# Altium footprint library AMLB_v1.PcbLib: 167 footprints (part 4 of 11)
Each footprint in its own frame and in the unit in brackets; x right, y up, seen from the top. Pads: shape width x height; smd on the part's side, far side on the other; paste and mask are expansions set on the pad; w line width, h text height; cw(c..) or ccw(c..) is an arc to the next point about the centre after c.
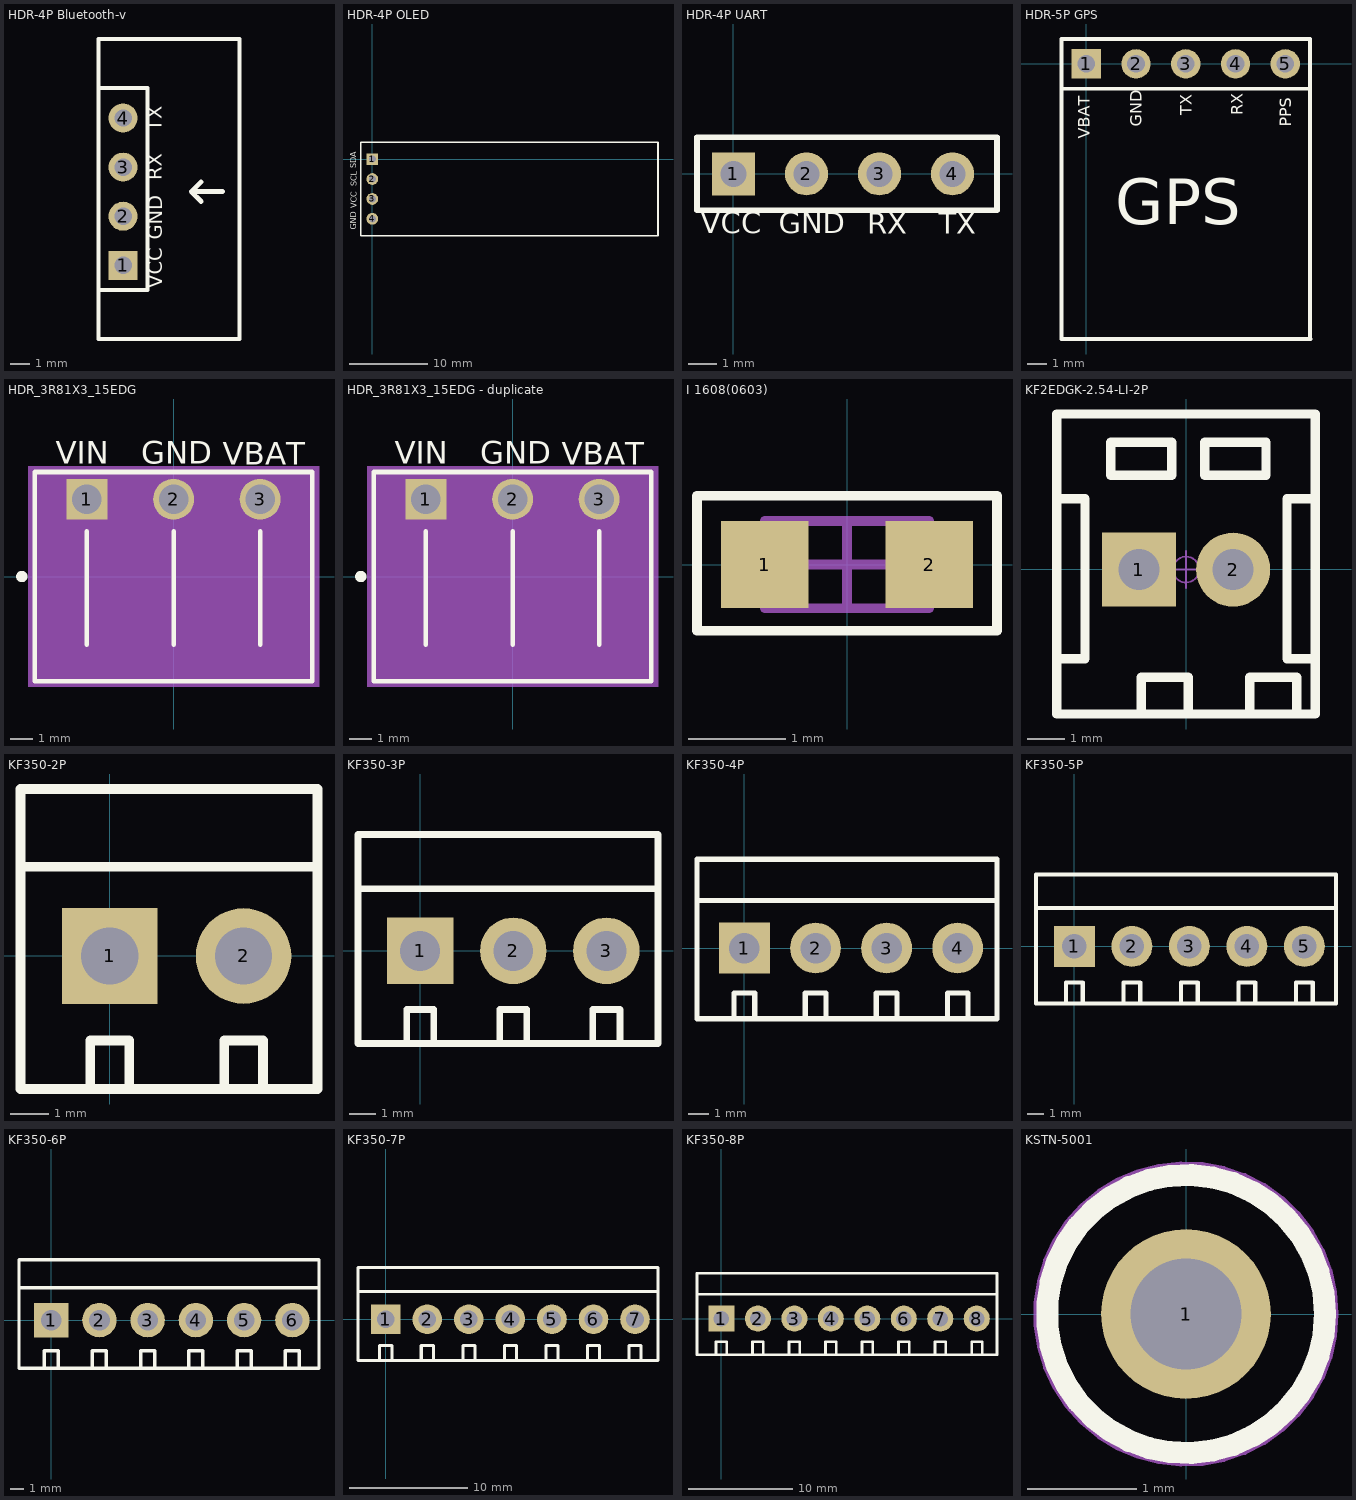
[diagram p3: the footprints below, top view; thin cyan lines are the x and y axes]

## HDR-4P Bluetooth-v [mm] "Connector; Header; 4 Position"
height 10
pads (4):
  rect 1.5x1.5 hole 0.9: 1(-11.989,-35.687)
  round 1.5 hole 0.9: 2(-11.989,-33.147) 3(-11.989,-30.607) 4(-11.989,-28.067)
Top Overlay:
  lines w0.2: -13.259,-39.497 -13.259,-23.978 -5.969,-23.978 -5.969,-39.497 -13.259,-39.497 ; -13.259,-36.957 -13.259,-26.518 -10.719,-26.518 -10.719,-36.957 -13.259,-36.957
  lines w0.254: -7.95,-32.385 -8.458,-31.877 ; -7.95,-31.369 -8.458,-31.877 ; -6.833,-31.877 -8.458,-31.877
  text "VCC" at -9.714,-36.881 h1.27
  text "RX" at -9.728,-31.293 h1.27
  text "TX" at -9.728,-28.753 h1.27
  text "GND" at -9.714,-34.366 h1.27
3D body "HDR2.54-1P_M.STEP": height 8.5, standoff -3, extent -13.259,-34.417 -10.719,-31.877
3D body "HDR2.54-1P_M.STEP": height 8.5, standoff -3, extent -13.259,-36.957 -10.719,-34.417
3D body "HDR2.54-1P_M.STEP": height 8.5, standoff -3, extent -13.259,-29.337 -10.719,-26.797
3D body "HDR2.54-1P_M.STEP": height 8.5, standoff -3, extent -13.259,-31.877 -10.719,-29.337

## HDR-4P OLED [mm] "Connector; Header; 4Position"
height 10
pads (4):
  rect 1.5x1.5 hole 0.9: 1(0,0)
  round 1.5 hole 0.9: 2(0,-2.54) 3(0,-5.08) 4(0,-7.62)
Top Overlay:
  lines w0.2: -1.5,-9.81 36.5,-9.81 36.5,2.19 -1.5,2.19 -1.5,-9.81
  text "VCC" at -1.753,-6.299 h1.27
  text "SDA" at -1.829,-1.168 h1.27
  text "SCL" at -1.753,-3.48 h1.27
  text "GND" at -1.803,-8.992 h1.27
3D body "HDR2.54-1P_M.STEP": height 8.5, standoff -3, extent -1.27,-3.81 1.27,-1.27
3D body "HDR2.54-1P_M.STEP": height 8.5, standoff -3, extent -1.27,-1.27 1.27,1.27
3D body "HDR2.54-1P_M.STEP": height 8.5, standoff -3, extent -1.27,-8.89 1.27,-6.35
3D body "HDR2.54-1P_M.STEP": height 8.5, standoff -3, extent -1.27,-6.35 1.27,-3.81

## HDR-4P UART [mm] "Connector; Header; 4 Position"
height 10
pads (4):
  rect 1.5x1.5 hole 0.9: 1(0,0)
  round 1.5 hole 0.9: 2(2.54,0) 3(5.08,0) 4(7.62,0)
Top Overlay:
  lines w0.2: -1.27,-1.27 -1.27,1.27 9.169,1.27 9.169,-1.27 -1.27,-1.27
  text "GND" at 1.575,-2.311 h1.27
  text "TX" at 7.137,-2.325 h1.27
  text "RX" at 4.648,-2.325 h1.27
  text "VCC" at -1.143,-2.311 h1.27
3D body "HDR2.54-1P.STEP": height 8.5, standoff -3, extent -1.27,-1.27 1.27,1.27
3D body "HDR2.54-1P.STEP": height 8.5, standoff -3, extent 1.27,-1.27 3.81,1.27
3D body "HDR2.54-1P.STEP": height 8.5, standoff -3, extent 3.81,-1.27 6.35,1.27
3D body "HDR2.54-1P.STEP": height 8.5, standoff -3, extent 6.35,-1.27 8.89,1.27

## HDR-5P GPS [mm] "Connector; Header; 5 Position"
height 10
pads (5):
  rect 1.5x1.5 hole 0.9: 1(0,0)
  round 1.5 hole 0.9: 2(2.54,0) 3(5.08,0) 4(7.62,0) 5(10.16,0)
Top Overlay:
  lines w0.2: -1.27,-1.143 -1.27,-14.046 11.455,-14.046 ; 11.43,-14.046 11.43,-1.041 ; -1.27,-1.27 11.43,-1.27 11.43,1.27 -1.27,1.27 -1.27,-1.27
  text "GPS" at 1.473,-8.966 h4
  text "VBAT" at 0.178,-3.81 h0.6
  text "GND" at 2.845,-3.21 h0.6
  text "TX" at 5.385,-2.61 h0.6
  text "RX" at 8.001,-2.61 h0.6
  text "PPS" at 10.465,-3.21 h0.6
3D body "HDR2.54-1P_M.STEP": height 8.5, standoff -3, extent 8.89,-1.27 11.43,1.27
3D body "HDR2.54-1P_M.STEP": height 8.5, standoff -3, extent 3.81,-1.27 6.35,1.27
3D body "HDR2.54-1P_M.STEP": height 8.5, standoff -3, extent 6.35,-1.27 8.89,1.27
3D body "HDR2.54-1P_M.STEP": height 8.5, standoff -3, extent -1.27,-1.27 1.27,1.27
3D body "HDR2.54-1P_M.STEP": height 8.5, standoff -3, extent 1.27,-1.27 3.81,1.27

## HDR_3R81X3_15EDG [mm] "HDR_3R81X3_15EDG"
pads (3):
  rect 1.8x1.8 / inner round 1.524 / far side rect 1.8x1.8 hole 1.3: 1(-3.81,3.4)
  round 1.8 / inner round 1.524 / far side round 1.8 hole 1.3: 2(0,3.4) 3(3.81,3.4)
Top Overlay:
  circle w0.25: c-6.675,0 r0.125
  lines w0.001: -6.115,-4.6 -6.115,4.6 6.115,4.6 6.115,-4.6 -6.115,-4.6
  lines w0.1: -6.115,-4.6 -6.115,4.6 6.115,4.6 6.115,-4.6 -6.115,-4.6
  lines w0.2: -3.81,-3 -3.81,2 ; 0,-3 0,2 ; 3.81,-3 3.81,2 ; -6.1,-4.6 -6.1,4.6 6.1,4.6 6.1,-4.6 -6.1,-4.6
  text "VBAT" at 2.159,4.928 h1
  text "GND" at -1.422,4.953 h1
  text "VIN" at -5.182,4.953 h1
Mechanical 8:
  text "1" at -3.81,3.146 h0.64
  text "2" at 0,3.146 h0.64
  text "3" at 3.81,3.146 h0.64
Mechanical 10:
  circle w0.05: c-3.81,0 r0.35
  region: -6.4,-4.85 -6.4,4.85 6.4,4.85 6.4,-4.85
  lines w0.05: -4.31,0 -3.31,0 ; -3.81,-0.5 -3.81,0.5
Mechanical 11:
  pour cut-out: -6.4,-4.85 -6.4,4.85 6.4,4.85 6.4,-4.85

## HDR_3R81X3_15EDG - duplicate [mm] "HDR_3R81X3_15EDG"
pads (3):
  rect 1.8x1.8 / inner round 1.524 / far side rect 1.8x1.8 hole 1.3: 1(-3.81,3.4)
  round 1.8 / inner round 1.524 / far side round 1.8 hole 1.3: 2(0,3.4) 3(3.81,3.4)
Top Overlay:
  circle w0.25: c-6.675,0 r0.125
  lines w0.001: -6.115,-4.6 6.115,-4.6 6.115,4.6 -6.115,4.6 -6.115,-4.6
  lines w0.1: -6.115,-4.6 6.115,-4.6 6.115,4.6 -6.115,4.6 -6.115,-4.6
  lines w0.2: -3.81,-3 -3.81,2 ; 0,-3 0,2 ; 3.81,-3 3.81,2 ; -6.1,-4.6 6.1,-4.6 6.1,4.6 -6.1,4.6 -6.1,-4.6
  text "VIN" at -5.182,4.953 h1
  text "GND" at -1.422,4.953 h1
  text "VBAT" at 2.159,4.928 h1
Mechanical 8:
  text "3" at 3.81,3.146 h0.64
  text "2" at 0,3.146 h0.64
  text "1" at -3.81,3.146 h0.64
Mechanical 10:
  circle w0.05: c-3.81,0 r0.35
  region: -6.4,-4.85 -6.4,4.85 6.4,4.85 6.4,-4.85
  lines w0.05: -4.31,0 -3.31,0 ; -3.81,-0.5 -3.81,0.5
Mechanical 11:
  pour cut-out: -6.4,-4.85 -6.4,4.85 6.4,4.85 6.4,-4.85

## I 1608(0603) [mm] "Chip Inductance, 2-Leads, Body 1.60x0.80mm, IPC Medium Density"
height 0.6
pads (2):
  rect 0.9x0.9 smd: 1(-0.85,0) 2(0.85,0)
Top Overlay:
  lines w0.1: -1.549,-0.686 -1.549,0.711 1.549,0.711 1.549,-0.686 -1.549,-0.686
Mechanical 13:
  lines w0.1: -0.85,-0.45 0.85,-0.45 0.85,0.45 -0.85,0.45 -0.85,-0.45
Mechanical 15:
  lines w0.05: -1.55,-0.7 1.55,-0.7 1.55,0.7 -1.55,0.7 -1.55,-0.7
  lines w0.1: -0.45,0 0.45,0 ; 0,-0.45 0,0.45
3D body "User Library-V0603HD.STEP": height 0.8, standoff 0, extent -0.825,-0.443 0.775,0.457

## KF2EDGK-2.54-LI-2P [mm] "长：6.93mm，宽：8.1mm，高：10.1mm"
pads (2):
  rect 2x2 hole 1.1: 1(-1.27,-0.009)
  round 2 hole 1.1: 2(1.27,-0.009)
Top Overlay:
  lines w0.254: -1.204,-3.848 -1.204,-2.921 0.066,-2.921 0.066,-3.848 ; 1.717,-3.848 1.717,-2.921 2.987,-2.921 2.987,-3.848 ; 3.49,-2.413 2.728,-2.413 2.728,1.905 3.49,1.905 ; -3.49,-2.413 -3.49,-3.909 3.49,-3.909 3.49,1.905 ; -3.49,-2.413 -2.728,-2.413 -2.728,1.905 -3.49,1.905 ; -3.49,-2.413 -3.49,1.905 ; -3.49,1.905 -3.49,4.191 3.49,4.191 3.49,1.905 ; -2.032,2.54 -0.381,2.54 -0.381,3.429 -2.032,3.429 -2.032,2.54 ; 0.508,2.54 0.508,3.429 2.159,3.429 2.159,2.54 0.508,2.54
Mechanical 15:
  circle w0.05: c0,-0.009 r0.35
  lines w0.05: -0.5,-0.009 0.5,-0.009 ; 0,-0.509 0,0.491
3D body "KF2EDGK-2.54-LI-2P.STEP": height 10.15, standoff -3.15, extent -3.49,-3.909 3.49,4.191

## KF350-2P [mm] "可拼接端子/10A"
pads (2):
  rect 2.5x2.5 hole 1.5: 1(0,0)
  round 2.5 hole 1.5: 2(3.5,0)
Top Overlay:
  lines w0.254: -2.337,2.337 5.436,2.337 ; -0.508,-3.48 -0.508,-2.21 0.508,-2.21 0.508,-3.48 ; 2.992,-3.48 2.992,-2.21 4.008,-2.21 4.008,-3.48 ; -2.337,-3.48 -2.337,4.369 5.436,4.369 5.436,-3.48 -2.337,-3.48
3D body "KF350.STEP": height 10, standoff -3.8, extent 1.35,-3.3 5.25,4.2
3D body "KF350.STEP": height 10, standoff -3.8, extent -2.15,-3.3 1.75,4.2

## KF350-3P [mm] "可拼接端子/10A"
pads (3):
  rect 2.5x2.5 hole 1.5: 1(0,0)
  round 2.5 hole 1.5: 2(3.5,0) 3(7,0)
Top Overlay:
  lines w0.254: -2.337,2.337 8.941,2.337 ; -0.508,-3.48 -0.508,-2.21 0.508,-2.21 0.508,-3.48 ; 2.992,-3.48 2.992,-2.21 4.008,-2.21 4.008,-3.48 ; 6.492,-3.48 6.492,-2.21 7.508,-2.21 7.508,-3.48 ; -2.337,-3.48 -2.337,4.369 8.941,4.369 8.941,-3.48 -2.337,-3.48
3D body "KF350.STEP": height 10, standoff -3.8, extent 1.35,-3.3 5.25,4.2
3D body "KF350.STEP": height 10, standoff -3.8, extent -2.15,-3.3 1.75,4.2
3D body "KF350.STEP": height 10, standoff -3.8, extent 4.85,-3.3 8.75,4.2

## KF350-4P [mm] "可拼接端子/10A"
pads (4):
  rect 2.5x2.5 hole 1.5: 1(0,0)
  round 2.5 hole 1.5: 2(3.5,0) 3(7,0) 4(10.5,0)
Top Overlay:
  lines w0.254: -2.337,2.337 12.436,2.337 ; -0.508,-3.48 -0.508,-2.21 0.508,-2.21 0.508,-3.48 ; 2.992,-3.48 2.992,-2.21 4.008,-2.21 4.008,-3.48 ; 6.492,-3.48 6.492,-2.21 7.508,-2.21 7.508,-3.48 ; 9.992,-3.48 9.992,-2.21 11.008,-2.21 11.008,-3.48 ; -2.337,-3.48 12.436,-3.48 12.436,4.369 -2.337,4.369 -2.337,-3.48
3D body "KF350.STEP": height 10, standoff -3.8, extent 8.35,-3.3 12.25,4.2
3D body "KF350.STEP": height 10, standoff -3.8, extent 4.85,-3.3 8.75,4.2
3D body "KF350.STEP": height 10, standoff -3.8, extent 1.35,-3.3 5.25,4.2
3D body "KF350.STEP": height 10, standoff -3.8, extent -2.15,-3.3 1.75,4.2

## KF350-5P [mm] "可拼接端子/10A"
pads (5):
  rect 2.5x2.5 hole 1.5: 1(0,0)
  round 2.5 hole 1.5: 2(3.5,0) 3(7,0) 4(10.5,0) 5(14,0)
Top Overlay:
  lines w0.254: -2.337,2.337 15.926,2.337 ; -0.508,-3.48 -0.508,-2.21 0.508,-2.21 0.508,-3.48 ; 2.992,-3.48 2.992,-2.21 4.008,-2.21 4.008,-3.48 ; 6.492,-3.48 6.492,-2.21 7.508,-2.21 7.508,-3.48 ; 9.992,-3.48 9.992,-2.21 11.008,-2.21 11.008,-3.48 ; 13.492,-3.48 13.492,-2.21 14.508,-2.21 14.508,-3.48 ; -2.337,-3.48 -2.337,4.369 15.926,4.369 15.926,-3.48 -2.337,-3.48
3D body "KF350.STEP": height 10, standoff -3.8, extent -2.15,-3.3 1.75,4.2
3D body "KF350.STEP": height 10, standoff -3.8, extent 1.35,-3.3 5.25,4.2
3D body "KF350.STEP": height 10, standoff -3.8, extent 4.85,-3.3 8.75,4.2
3D body "KF350.STEP": height 10, standoff -3.8, extent 8.35,-3.3 12.25,4.2
3D body "KF350.STEP": height 10, standoff -3.8, extent 11.85,-3.3 15.75,4.2

## KF350-6P [mm] "可拼接端子/10A"
pads (6):
  rect 2.5x2.5 hole 1.5: 1(0,0)
  round 2.5 hole 1.5: 2(3.5,0) 3(7,0) 4(10.5,0) 5(14,0) 6(17.5,0)
Top Overlay:
  lines w0.254: -2.337,2.337 19.41,2.337 ; -0.508,-3.48 -0.508,-2.21 0.508,-2.21 0.508,-3.48 ; 2.992,-3.48 2.992,-2.21 4.008,-2.21 4.008,-3.48 ; 6.492,-3.48 6.492,-2.21 7.508,-2.21 7.508,-3.48 ; 9.992,-3.48 9.992,-2.21 11.008,-2.21 11.008,-3.48 ; 13.492,-3.48 13.492,-2.21 14.508,-2.21 14.508,-3.48 ; 16.993,-3.48 16.993,-2.21 18.009,-2.21 18.009,-3.48 ; -2.337,-3.48 -2.337,4.369 19.436,4.369 19.436,-3.48 -2.337,-3.48
3D body "KF350.STEP": height 10, standoff -3.8, extent 15.35,-3.3 19.25,4.2
3D body "KF350.STEP": height 10, standoff -3.8, extent 11.85,-3.3 15.75,4.2
3D body "KF350.STEP": height 10, standoff -3.8, extent 8.35,-3.3 12.25,4.2
3D body "KF350.STEP": height 10, standoff -3.8, extent 4.85,-3.3 8.75,4.2
3D body "KF350.STEP": height 10, standoff -3.8, extent 1.35,-3.3 5.25,4.2
3D body "KF350.STEP": height 10, standoff -3.8, extent -2.15,-3.3 1.75,4.2

## KF350-7P [mm] "可拼接端子/10A"
pads (7):
  rect 2.5x2.5 hole 1.5: 1(0,0)
  round 2.5 hole 1.5: 2(3.5,0) 3(7,0) 4(10.5,0) 5(14,0) 6(17.5,0) 7(21,0)
Top Overlay:
  lines w0.254: -2.337,2.337 22.936,2.337 ; -0.508,-3.48 -0.508,-2.21 0.508,-2.21 0.508,-3.48 ; 2.992,-3.48 2.992,-2.21 4.008,-2.21 4.008,-3.48 ; 6.492,-3.48 6.492,-2.21 7.508,-2.21 7.508,-3.48 ; 9.992,-3.48 9.992,-2.21 11.008,-2.21 11.008,-3.48 ; 13.492,-3.48 13.492,-2.21 14.508,-2.21 14.508,-3.48 ; 16.993,-3.48 16.993,-2.21 18.009,-2.21 18.009,-3.48 ; 20.498,-3.48 20.498,-2.21 21.514,-2.21 21.514,-3.48 ; -2.337,-3.48 -2.337,4.369 22.936,4.369 22.936,-3.48 -2.337,-3.48
3D body "KF350.STEP": height 10, standoff -3.8, extent -2.15,-3.3 1.75,4.2
3D body "KF350.STEP": height 10, standoff -3.8, extent 1.35,-3.3 5.25,4.2
3D body "KF350.STEP": height 10, standoff -3.8, extent 4.85,-3.3 8.75,4.2
3D body "KF350.STEP": height 10, standoff -3.8, extent 8.35,-3.3 12.25,4.2
3D body "KF350.STEP": height 10, standoff -3.8, extent 11.85,-3.3 15.75,4.2
3D body "KF350.STEP": height 10, standoff -3.8, extent 15.35,-3.3 19.25,4.2
3D body "KF350.STEP": height 10, standoff -3.8, extent 18.85,-3.3 22.75,4.2

## KF350-8P [mm] "可拼接端子/10A"
pads (8):
  rect 2.5x2.5 hole 1.5: 1(0,0)
  round 2.5 hole 1.5: 2(3.5,0) 3(7,0) 4(10.5,0) 5(14,0) 6(17.5,0) 7(21,0) 8(24.5,0)
Top Overlay:
  lines w0.254: -2.337,2.337 26.441,2.337 ; -0.508,-3.48 -0.508,-2.21 0.508,-2.21 0.508,-3.48 ; 2.992,-3.48 2.992,-2.21 4.008,-2.21 4.008,-3.48 ; 6.492,-3.48 6.492,-2.21 7.508,-2.21 7.508,-3.48 ; 9.992,-3.48 9.992,-2.21 11.008,-2.21 11.008,-3.48 ; 13.492,-3.48 13.492,-2.21 14.508,-2.21 14.508,-3.48 ; 16.993,-3.48 16.993,-2.21 18.009,-2.21 18.009,-3.48 ; 20.498,-3.48 20.498,-2.21 21.514,-2.21 21.514,-3.48 ; 24.003,-3.48 24.003,-2.21 25.019,-2.21 25.019,-3.48 ; -2.337,-3.48 26.441,-3.48 26.441,4.369 -2.337,4.369 -2.337,-3.48
3D body "KF350.STEP": height 10, standoff -3.8, extent 22.35,-3.3 26.25,4.2
3D body "KF350.STEP": height 10, standoff -3.8, extent 18.85,-3.3 22.75,4.2
3D body "KF350.STEP": height 10, standoff -3.8, extent 15.35,-3.3 19.25,4.2
3D body "KF350.STEP": height 10, standoff -3.8, extent 11.85,-3.3 15.75,4.2
3D body "KF350.STEP": height 10, standoff -3.8, extent 8.35,-3.3 12.25,4.2
3D body "KF350.STEP": height 10, standoff -3.8, extent 4.85,-3.3 8.75,4.2
3D body "KF350.STEP": height 10, standoff -3.8, extent 1.35,-3.3 5.25,4.2
3D body "KF350.STEP": height 10, standoff -3.8, extent -2.15,-3.3 1.75,4.2

## KSTN-5001 [mm] "Test Point, Through Hole, Dia 2.54mm"
height 4.57
pads (1):
  round 1.55 hole 1.016: 1(0,0)
Top Overlay:
  circle w0.2: c0,0 r1.27
Mechanical 13:
  circle w0.1: c0,0 r1.27
Mechanical 15:
  circle w0.05: c0,0 r1.37
  lines w0.1: -0.5,0 0.5,0 -0.5,0 ; 0,-0.5 0,0.5 0,-0.5
3D body "Keystone_5001.stp": height 4.62, standoff -3, extent -1.254,-1.247 1.246,1.253